# Altium schematic symbol library BARKO_SCHLIB.SchLib: 1064 symbols (part 10 of 11) (continued)
## R-910R-0603_1 (continued)
RES SMD 910 OHM 1% 1/10W 0603; Manufacturer: Vishay; Manufacturer Part Number: CRCW0603910RFKEA; Temperature Coefficient: 100ppm/°C; Power Rating: 100mW; Voltage Rating: 75V; .PCBCHK: USED; .Creator: F:TALI; Washability: OK; Stock 1: 7; Pricing 1: 1=0.09, 10=0.037, 100=0.0149, 1000=0.00668, 2500=0.0058 (EUR); Case/Package: 0603; Number of Pins: 2; Weight: 7.1E-05oz; Contact Plating: Tin; Case Code (Metric): 1608; Min Operating Temperature: -55°C; Max Operating Temperature: 155°C; Resistance: 910R; Tolerance: 1%; Composition: Thick Film; Packaging: Tape and Reel; Package Quantity: 10; Number of Terminations: 2; Termination: SMD/SMT; Max Power Dissipation: 100mW; Features: Automotive AEC-Q200; Military Standard: Not; Voltage Rating (DC): 75V; Length: 1.55mm; Height: 0.45mm; Width: 0.033inch; Depth: 0.85mm; Radiation Hardening: No; Lead Free: Lead Free; REACH SVHC: Unknown; ComponentLink1URL: https://www.distrelec.biz/Web/Downloads/a_/en/flD-CRCW-e3_data_en.pdf?mime=application%2Fpdf; ComponentLink1Description: https://www.distrelec.biz/Web/Downloads/a_/en/flD-CRCW-e3_data_en.pdf?mime=application%2Fpdf; ComponentLink2URL: http://www.vishay.com/docs/20035/dcrcwe3.pdf; ComponentLink2Description: http://www.vishay.com/docs/20035/dcrcwe3.pdf; ComponentLink3URL: http://www.farnell.com/datasheets/1697337.pdf; ComponentLink3Description: http://www.farnell.com/datasheets/1697337.pdf; ComponentLink4URL: http://uk.rs-online.com/webdocs/0d98/0900766b80d98afc.pdf; ComponentLink4Description: http://uk.rs-online.com/webdocs/0d98/0900766b80d98afc.pdf; ComponentLink5URL: http://www.mouser.com/ds/2/427/dcrcwe3-109170.pdf; ComponentLink5Description: http://www.mouser.com/ds/2/427/dcrcwe3-109170.pdf; ComponentLink6URL: https://www.alliedelec.com/m/d/0c934d6939ccefa68dbe0b96d821c8cf.pdf; ComponentLink6Description: https://www.alliedelec.com/m/d/0c934d6939ccefa68dbe0b96d821c8cf.pdf; Stock 2: 102470; Pricing 2: 1=0.1, 10=0.065, 100=0.0264, 1000=0.01186, 2500=0.01029 (USD); Mount: Surface Mount; ComponentLink7URL: http://www.farnell.com/datasheets/1678782.pdf; ComponentLink7Description: http://www.farnell.com/datasheets/1678782.pdf; ComponentLink8URL: http://www.mouser.com/ds/2/315/AOA0000C86-911473.pdf; ComponentLink8Description: http://www.mouser.com/ds/2/315/AOA0000C86-911473.pdf; Stock 3: 9760; Pricing 3: 1=0.1, 10=0.021, 100=0.0086, 1000=0.00385, 2500=0.00334 (USD); Thickness: 457um; ComponentLink9URL: http://www.bourns.com/docs/Product-Datasheets/CHPREZTR.pdf; ComponentLink9Description: http://www.bourns.com/docs/Product-Datasheets/CHPREZTR.pdf; ComponentLink10URL: http://www.bourns.com/pdfs/chpreztr.pdf; ComponentLink10Description: http://www.bourns.com/pdfs/chpreztr.pdf; .SCHCHK: USED; Supplier 1: Digi-Key; Supplier Part Number 1: 541-910HCT-ND
footprint R-0603
pins: 1, 2

## R-JMP-S1911-46R
designator R?, comment 0R
JUMPER TIN SMD; Manufacturer: Harwin; Manufacturer Part Number: S1911-46R; Number of Positions: 2; Gender: Non-Gendered; Pitch: 0.119inch; .Creator: M.OZKAN; .PCBCHK: USED; Supplier 1: Digi-Key; Supplier Part Number 1: 952-1740-1-ND; Stock: 75482; Pricing: 1=0.28, 10=0.27, 25=0.2312, 50=0.1964, 100=0.1887, 250=0.1694, 500=0.1617, 1000=0.1348 (USD); RoHS: Yes; Color: Silver; Contact Material: Brass,Copper Alloy; Contact Plating: Tin; Material: Brass; Plating: Tin; Orientation: Straight; Number of Contacts: 2; Package Quantity: 4000; Packaging: Tape and Reel; Number of Rows: 1; Termination: SMD/SMT; Length: 6.85mm; Height: 0.038inch; Depth: 2.51mm; REACH SVHC: No SVHC; ComponentLink1URL: https://datasheet.ciiva.com/22627/1682347-22627073.pdf?src-supplier=Element14; ComponentLink1Description: https://datasheet.ciiva.com/22627/1682347-22627073.pdf?src-supplier=Element14; ComponentLink2URL: https://datasheet.ciiva.com/5224/s1911r-64735-5224691.pdf?src-supplier=Mouser; ComponentLink2Description: https://datasheet.ciiva.com/5224/s1911r-64735-5224691.pdf?src-supplier=Mouser; ComponentLink3URL: https://datasheet.ciiva.com/26852/getdatasheetpartid-716620-26852325.pdf?src-supplier=Verical; ComponentLink3Description: https://datasheet.ciiva.com/26852/getdatasheetpartid-716620-26852325.pdf?src-supplier=Verical; ComponentLink4URL: https://datasheet.ciiva.com/30493/0900766b81270b7b-30493566.pdf?src-supplier=RSComponents; ComponentLink4Description: https://datasheet.ciiva.com/30493/0900766b81270b7b-30493566.pdf?src-supplier=RSComponents; ComponentLink5URL: https://datasheet.ciiva.com/6783/s1911r-6783671.pdf?src-supplier=Digi-Key; ComponentLink5Description: https://datasheet.ciiva.com/6783/s1911r-6783671.pdf?src-supplier=Digi-Key; .SCHCHK: USED
footprint R-JMP (Chip Resistor, 2-Leads, Body 6.85x2.00mm, IPC Medium Density)
pins: 1, 2

## RLY-ALDP124W
designator K?, comment ALDP124W
RELAY GEN PURPOSE SPST 5A 24V; Manufacturer: Panasonic; Voltage Rating (AC): 277V; Power Rating: 200mW; Coil Resistance: 2.88kR; Coil Current: 8.3mA; Operate Time: 10ms; Switching Capacity: 1.385kW; Relay Type: General Purpose; Coil Type: Non-Latching; Washability: OK; .Creator: M.OZKAN; .PCBCHK: USED; Supplier 1: Digi-Key; Manufacturer Part Number: ALDP124W; Stock 1: 7190; Pricing 1: 1=2,23000, 10=2,09300, 25=1,86000, 50=1,76700, 100=1,67400, 300=1,48800, 500=1,39500, 1000=1,30200, 5000=1,25550 (USD); RoHS: Yes; Number of Pins: 4; Contact Material: Silver; Contact Plating: Silver; Min Operating Temperature: -40°C; Max Operating Temperature: 85°C; Contact Current Rating: 5A; Package Quantity: 100; Packaging: Carton; Max Current Rating: 5A; Throw Configuration: SPST; Termination: PC Pin; Release Time: 10ms; Coil Power: 200mW; Max Voltage Rating (AC): 277V; Switching Current: 5A; Coil Voltage (DC): 24V; Length: 20.5mm; Depth: 7.2mm; Lead Free: Lead Free; ComponentLink1URL: https://datasheet.ciiva.com/18711/ds-61b10-en-ldp-18711613.pdf?src-supplier=Distrelec; ComponentLink1Description: https://datasheet.ciiva.com/18711/ds-61b10-en-ldp-18711613.pdf?src-supplier=Distrelec; Supplier Part Number 1: 255-3590-ND; .SCHCHK: USED
footprint RLY-ALD-P105
pins: 1, 2 NC, 3 NO, 4 COM, 5

## RLY-ALQ105
designator K?, comment ALQ105
RELAY GEN PURPOSE SPDT 10A 5V; Manufacturer: Panasonic; Max Voltage Rating (AC): 250V; Power Rating: 400mW; Coil Resistance: 62.5R; Coil Current: 80mA; Operate Time: 20ms; Coil Type: Non-Latching; Relay Type: General Purpose; Washability: OK; .Creator: M.OZKAN; .PCBCHK: USED; ComponentLink1Description: Manufacturer URL; ComponentLink3Description: Package Specification; ComponentLink1URL: http://www3.panasonic.biz/ac/ae/index.jsp; ComponentLink3URL: http://www3.panasonic.biz/ac/e_download/control/relay/power/catalog/mech_eng_lq.pdf?f_cd=401220; ComponentLink2Description: Datasheet; ComponentLink2URL: http://www3.panasonic.biz/ac/e_download/control/relay/power/catalog/mech_eng_lq.pdf?f_cd=401220; Supplier 1: Digi-Key; Manufacturer Part Number: ALQ105; Stock 1: 17120; Pricing 1: 1=1.22000, 10=1.14800, 25=1.02000, 50=0.96900, 100=0.91800, 250=0.81600, 500=0.76500, 1000=0.71400, 5000=0.68850 (USD); RoHS: Yes; Number of Pins: 5; Weight: 7g; Contact Material: Silver; Min Operating Temperature: -40°C; Max Operating Temperature: 85°C; Contact Current Rating: 10A; Package Quantity: 100; Packaging: Carton; Voltage Rating (AC): 250V; Power Consumption: 400mW; Throw Configuration: SPDT; Termination: PC Pin; Release Time: 20ms; Coil Power: 400mW; Coil Voltage (DC): 5V; Length: 20mm; Height: 16mm; Depth: 10mm; Width: 10mm; REACH SVHC: Unknown; Lead Free: Lead Free; ComponentLink4URL: http://www.farnell.com/datasheets/1972641.pdf?src-supplier=Farnell; ComponentLink4Description: http://www.farnell.com/datasheets/1972641.pdf?src-supplier=Farnell; ComponentLink5URL: http://www.mouser.com/ds/2/315/lq-catalog-1075796.pdf?src-supplier=Mouser; ComponentLink5Description: http://www.mouser.com/ds/2/315/lq-catalog-1075796.pdf?src-supplier=Mouser; ComponentLink6URL: http://components.arrow.com/part/dataview/0323_06571492?src-supplier=Arrow+Europe; ComponentLink6Description: http://components.arrow.com/part/dataview/0323_06571492?src-supplier=Arrow+Europe; ComponentLink7URL: http://www.alliedelec.com/m/d/b3e6213128df2023f710f2e9cac83292.pdf?src-supplier=Allied+Electronics; ComponentLink7Description: http://www.alliedelec.com/m/d/b3e6213128df2023f710f2e9cac83292.pdf?src-supplier=Allied+Electronics; ComponentLink8URL: https://media.digikey.com/pdf/Data%20Sheets/Panasonic%20Electric%20Works%20PDFs/ALQ(LQ)Relays_NewProdIntro.pdf?src-supplier=Digi-Key; ComponentLink8Description: https://media.digikey.com/pdf/Data%20Sheets/Panasonic%20Electric%20Works%20PDFs/ALQ(LQ)Relays_NewProdIntro.pdf?src-supplier=Digi-Key; ComponentLink9URL: http://www.farnell.com/datasheets/1972641.pdf?src-supplier=Element14; ComponentLink9Description: http://www.farnell.com/datasheets/1972641.pdf?src-supplier=Element14; .SCHCHK: USED
footprint PNSC-LQ-5-2000x1000x1600_V (LQ, 5-Leads, Body 20x10mm)
pins: 1, 2 NC, 3 NO, 4 COM, 5

## RLY-AZ943-1CH-18DE
designator RLY?, comment AZ943-1CH-18DE
15AMP Mini PC Board Relay 18VDC coil SPDT; Manufacturer: American Zettler; Coil Current: 20mA; Coil Resistance: 900R; Max Voltage Rating (AC): 300V; Max Voltage Rating (DC): 30V; Coil Voltage (DC): 18V; .Creator: F:TALI; .PCBCHK: USED; Washability: OK; Supplier 1: Electro Sonic; Manufacturer Part Number: AZ943-1CH-18DE; Stock 1: 365; Pricing 1: 35=0.8063, 50=0.6365 (USD); Mount: Through Hole; Number of Pins: 5; Min Operating Temperature: -40°C; Max Operating Temperature: 90°C; Throw Configuration: SPDT; Length: 19mm; Height: 15.7mm; Width: 15.3mm; ComponentLink1URL: http://www.onlinecomponents.com/productFiles/mf-AZ/az943.pdf?src-supplier=Onlinecomponents.com; ComponentLink1Description: http://www.onlinecomponents.com/productFiles/mf-AZ/az943.pdf?src-supplier=Onlinecomponents.com; ComponentLink2URL: http://www.produktinfo.conrad.com/datenblaetter/500000-524999/503613-da-01-en-RELAIS_ZETTLER_AZ943_1CH_18DE.pdf?src-supplier=Conrad; ComponentLink2Description: http://www.produktinfo.conrad.com/datenblaetter/500000-524999/503613-da-01-en-RELAIS_ZETTLER_AZ943_1CH_18DE.pdf?src-supplier=Conrad; Supplier Part Number 1: AZ9431CH18DE; .SCHCHK: USED
footprint RLY-AZ943
pins: 1, 2, 3, 4, 5

## RLY-CPC1706Y
designator K?, comment CPC1706Y
SSR RELAY SPST-NO 4A 0-60V; Manufacturer: IXYS; Output Voltage: 60V; Input Current: 50mA; On-State Resistance: 90mR; Isolation Voltage: 2.5kV; Throw Configuration: SPST; Supplier 1: Digi-Key; Supplier Part Number 1: CPC1706Y-ND; Manufacturer Part Number: CPC1706Y; Stock: 300; Pricing: 1=3, 10=2.813, 25=2.5, 50=2.375, 100=2.25, 250=2, 500=1.875, 1000=1.75, 5000=1.6875 (USD); RoHS: Yes; Mount: Through Hole; Case/Package: SIP; Number of Pins: 4; Min Operating Temperature: -40°C; Max Operating Temperature: 85°C; Termination: PC Pin; Output Current: 4A; Load Current: 4A; Max Output Voltage: 60V; Relay Type: Relay; Package Quantity: 25; Packaging: Rail/Tube; Radiation Hardening: No; Lead Free: Lead Free; ComponentLink1URL: https://datasheet.ciiva.com/6569/cpc1706-6569415.pdf?src-supplier=Digi-Key; ComponentLink1Description: https://datasheet.ciiva.com/6569/cpc1706-6569415.pdf?src-supplier=Digi-Key
footprint RLY-4SIP
pins: 1 -, 2 +, 3 -, 4 +

## RLY-CPC1709J
designator K?, comment CPC1709J
SSR RELAY SPST-NO 9A 0-60V; Manufacturer: Ixys Clare; Throw Configuration: SPST; Output Current: 32A; Input Current: 50mA; Max Power Dissipation: 150mW; On-State Resistance: 50mR; Max Output Voltage: 60V; Max Input Current: 100mA; Isolation Voltage: 2.5kV; Max Input Voltage: 1.4V; Supplier 1: Digi-Key; Supplier Part Number 1: CLA280-ND; Manufacturer Part Number: CPC1709J; Stock: 1167; Pricing: 1=6.29, 10=5.895, 25=5.24, 50=4.978, 100=4.716, 250=4.192, 500=3.93, 1000=3.668, 5000=3.537 (USD); RoHS: Yes; Mount: Through Hole; Number of Pins: 4; Min Operating Temperature: -40°C; Max Operating Temperature: 85°C; Package Quantity: 25; Termination: PC Pin; Load Current: 9A; Packaging: Rail/Tube; Relay Type: Relay; Max Output Current: 32A; Radiation Hardening: No; Lead Free: Lead Free; ComponentLink1URL: https://datasheet.ciiva.com/15709/2cpc1709-15709048.pdf?src-supplier=Onlinecomponents.com; ComponentLink1Description: https://datasheet.ciiva.com/15709/2cpc1709-15709048.pdf?src-supplier=Onlinecomponents.com; ComponentLink2URL: https://datasheet.ciiva.com/2421/cpc1709-2421621.pdf?src-supplier=Digi-Key; ComponentLink2Description: https://datasheet.ciiva.com/2421/cpc1709-2421621.pdf?src-supplier=Digi-Key
footprint RLY-ISOPLUS264 (SIL, 4-Leads, Body 21x3.5mm)
pins: 1 -, 2 +, 3 -, 4 +

## RT-NCP18XH103F03RB
designator RT?, comment 10K  Case Code (Imperial): 0603
THERMISTOR 10K OHM NTC 0603 SMD; Manufacturer: Murata; Manufacturer Part Number: NCP18XH103F03RB; Resistance: 10kR; Tolerance: 1%; Power Rating: 100mW; Current Rating: 310uA; Accuracy: 0.7%; .Creator: F:TALI; .PCBCHK: USED; Temperature Coefficient: 100ppm/°C; Washability: OK; Dielectric: X7R; Voltage Rating: 100V; Capacitance: 100nF; Supplier 1: Digi-Key; Stock 1: 17485; Pricing 1: 1=0.23, 5=0.222, 10=0.198, 25=0.182, 50=0.1456, 100=0.1249, 500=0.10926, 1000=0.09365 (USD); Mount: Surface Mount; Case/Package: 0603; Number of Pins: 2; Case Code (Metric): 1608; Number of Terminals: 2; Min Operating Temperature: -40°C; Max Operating Temperature: 125°C; Packaging: Tape and Reel; Package Quantity: 1; Termination: SMD/SMT; Max Power Dissipation: 100mW; Length: 1.6mm; Height: 0.8mm; Depth: 0.8mm; Radiation Hardening: No; REACH SVHC: No SVHC; Lead Free: Lead Free; ComponentLink1URL: http://www.mouser.com/ds/2/281/r44e-522712.pdf; ComponentLink1Description: http://www.mouser.com/ds/2/281/r44e-522712.pdf; ComponentLink2URL: http://uk.rs-online.com/webdocs/07f1/0900766b807f1e39.pdf; ComponentLink2Description: http://uk.rs-online.com/webdocs/07f1/0900766b807f1e39.pdf; ComponentLink3URL: http://www.murata.com/~/media/webrenewal/support/library/catalog/products/thermistor/ntc/r44e.ashx; ComponentLink3Description: http://www.murata.com/~/media/webrenewal/support/library/catalog/products/thermistor/ntc/r44e.ashx; ComponentLink4URL: https://www.verical.com/server-webapp/html/getDatasheet?partID=153236; ComponentLink4Description: https://www.verical.com/server-webapp/html/getDatasheet?partID=153236; ComponentLink5URL: https://www.murata.com/~/media/webrenewal/support/library/catalog/products/thermistor/ntc/r44e.ashx?la=en-us; ComponentLink5Description: https://www.murata.com/~/media/webrenewal/support/library/catalog/products/thermistor/ntc/r44e.ashx?la=en-us; ComponentLink6URL: http://search.murata.co.jp/Ceramy/image/img/w_hinm/L0770E.pdf; ComponentLink6Description: http://search.murata.co.jp/Ceramy/image/img/w_hinm/L0770E.pdf; Supplier Part Number 1: 490-4800-6-ND; .SCHCHK: USED; RoHS: Yes; Composition: Metal Foil; Number of Terminations: 2; Features: Automotive AEC-Q200; Width: 1.6mm; ComponentLink7URL: https://datasheet.ciiva.com/14981/krl-new-short-data-sheet-14981981.pdf?src-supplier=Digi-Key; ComponentLink7Description: https://datasheet.ciiva.com/14981/krl-new-short-data-sheet-14981981.pdf?src-supplier=Digi-Key; ComponentLink8URL: https://datasheet.ciiva.com/14981/krl-new-short-data-sheet-14981982.pdf?src-supplier=Digi-Key; ComponentLink8Description: https://datasheet.ciiva.com/14981/krl-new-short-data-sheet-14981982.pdf?src-supplier=Digi-Key; Stock: 963388; Pricing: 1=0.1, 10=0.054, 50=0.0294, 100=0.0239, 500=0.0171, 1000=0.0134 (USD); Thickness: 0.053inch; ComponentLink9URL: https://datasheet.ciiva.com/26936/getdatasheetpartid-781823-26936904.pdf?src-supplier=Verical; ComponentLink9Description: https://datasheet.ciiva.com/26936/getdatasheetpartid-781823-26936904.pdf?src-supplier=Verical
footprint R-0603
pins: 1, 2

## SSR-CPC1017NTR
designator U?, comment CPC1017NTR  Case/Package: 4-SOP
SSR RELAY SPST-NO 100MA 0-60V; Manufacturer: Ixys Clare; Output Voltage: 60V; Throw Configuration: SPST; Max Input Voltage: 1.4V; On-State Resistance: 16R; Max Power Dissipation: 400mW; Max Input Current: 50mA; Isolation Voltage: 1.5kV; Number of Channels: 1; Capacitance: 1pF; Turn-On Delay Time: 10ms; Washability: OK; .Creator: M.OZKAN; .PCBCHK: USED; Supplier 1: Digi-Key; Manufacturer Part Number: CPC1017NTR; Stock 1: 25719; Pricing 1: 1=0,79000, 10=0,74300, 25=0,66000, 50=0,62700, 100=0,59400, 250=0,52800, 500=0,49500, 1000=0,46200 (USD); RoHS: Yes; Mount: Surface Mount; Number of Pins: 4; Min Operating Temperature: -40°C; Max Operating Temperature: 85°C; Output Current: 100mA; Packaging: Tape and Reel; Max Output Current: 100mA; Package Quantity: 2000; Load Current: 100mA; Termination: Gull Wing; Max Output Voltage: 60V; Input Current: 50mA; Relay Type: Relay; Turn-Off Delay Time: 10ms; Length: 4.089mm; Height: 2.184mm; Width: 3.8mm; Radiation Hardening: No; ComponentLink1URL: https://datasheet.ciiva.com/2421/cpc1017n-2421248.pdf?src-supplier=Digi-Key; ComponentLink1Description: https://datasheet.ciiva.com/2421/cpc1017n-2421248.pdf?src-supplier=Digi-Key; ComponentLink2URL: https://datasheet.ciiva.com/2421/cpc1017n-2421249.pdf?src-supplier=Digi-Key; ComponentLink2Description: https://datasheet.ciiva.com/2421/cpc1017n-2421249.pdf?src-supplier=Digi-Key; ComponentLink3URL: https://datasheet.ciiva.com/4469/cpc1017n-16278-4469629.pdf?src-supplier=Mouser; ComponentLink3Description: https://datasheet.ciiva.com/4469/cpc1017n-16278-4469629.pdf?src-supplier=Mouser; ComponentLink4URL: https://datasheet.ciiva.com/2421/cpc1017n-2421247.pdf?src-supplier=Digi-Key; ComponentLink4Description: https://datasheet.ciiva.com/2421/cpc1017n-2421247.pdf?src-supplier=Digi-Key; Supplier Part Number 1: CLA233CT-ND; .SCHCHK: USED
footprint SOP_4
pins: 1 CNTRL+, 2 CNTRL-, 3 LOAD, 4 LOAD

## SW5-00P
designator SW?, comment SW5-00P-150-C5
SWITCH SNAP ACTION SPDT 5A 250V; Washability: OK; .Creator: M.OZKAN; .PCBCHK: USED; .SCHCHK: USED
footprint SW5-00P (SW5-00P-150-C5  SWITCH SNAP ACTION SPDT 5A 250V)
pins: C COM, NC, NO

## SW-AYZ0202AGRLC
designator SW?, comment DPDT
SWITCH SLIDE DPDT 100MA 12V; Manufacturer: ITT C&K; Manufacturer Part Number: AYZ0202AGRLC; Mechanical Life: 10000Cycles; Actuator Material: Nylon,Glass,Polyamide,Glass fibre; Actuator Type: Standard; Illumination Type: Non-Illuminated; Contact Resistance: 80mR; Switch Function: On-On; Actuator Length: 1mm; Supplier 1: RSComponents; Supplier Part Number 1: 7931504; Stock: 377; Pricing: 1=1.326, 50=1.209, 100=1.105, 1000=1.027, 3000=0.962, 1=10.2, 50=9.3, 100=8.5, 1000=7.9, 3000=7.4 (EUR); RoHS: Yes; Mount: Surface Mount,PCB; Case/Package: 100; Contact Material: Copper Alloy,Brass,Silver; Housing Material: Glass; Contact Plating: Silver; Min Operating Temperature: -10°C; Max Operating Temperature: 60°C; Termination: Gull Wing; Throw Configuration: DPDT; Max Current Rating: 100mA; Max Voltage Rating (DC): 12V; Voltage Rating (DC): 12V; Package Quantity: 1; Packaging: Tape and Reel; Current Rating: 100mA; Contact Current Rating: 100mA; Orientation: Vertical; Length: 7.2mm; Depth: 6mm; Radiation Hardening: No; Lead Free: Lead Free; REACH SVHC: No SVHC; ComponentLink1URL: https://datasheet.ciiva.com/16417/ayz0202agrlc-16417120.pdf?src-supplier=Future+Electronics; ComponentLink1Description: https://datasheet.ciiva.com/16417/ayz0202agrlc-16417120.pdf?src-supplier=Future+Electronics; ComponentLink2URL: https://datasheet.ciiva.com/2889/ayz-16oct13-2889189.pdf?src-supplier=Digi-Key; ComponentLink2Description: https://datasheet.ciiva.com/2889/ayz-16oct13-2889189.pdf?src-supplier=Digi-Key; ComponentLink3URL: https://datasheet.ciiva.com/8624/ayz-16oct13-8624741.pdf?src-supplier=Avnet; ComponentLink3Description: https://datasheet.ciiva.com/8624/ayz-16oct13-8624741.pdf?src-supplier=Avnet; ComponentLink4URL: https://datasheet.ciiva.com/2889/ayz-16oct13-2889190.pdf?src-supplier=Digi-Key; ComponentLink4Description: https://datasheet.ciiva.com/2889/ayz-16oct13-2889190.pdf?src-supplier=Digi-Key; ComponentLink5URL: https://datasheet.ciiva.com/2889/ayz-16oct13-2889191.pdf?src-supplier=Digi-Key; ComponentLink5Description: https://datasheet.ciiva.com/2889/ayz-16oct13-2889191.pdf?src-supplier=Digi-Key; ComponentLink6URL: https://datasheet.ciiva.com/16174/ayz-24mar-16174248.pdf?src-supplier=Onlinecomponents.com; ComponentLink6Description: https://datasheet.ciiva.com/16174/ayz-24mar-16174248.pdf?src-supplier=Onlinecomponents.com; ComponentLink7URL: https://datasheet.ciiva.com/22630/1707705-22630555.pdf?src-supplier=Element14; ComponentLink7Description: https://datasheet.ciiva.com/22630/1707705-22630555.pdf?src-supplier=Element14
footprint SW-AYZ0202AGRLC
pins: 1, 2, 3, 4, 5, 6

## SW-B3S-1000P
designator SW?, comment B3S-1000P  Supplier Part Number 1: SW836CT-ND
SWITCH TACTILE SPST-NO 0.05A 24V; Manufacturer 1: Omron; Throw Configuration: SPST; Switch Function: Off-Mom; Switch Travel: 0.25mm; Contact Current Rating: 50mA; Actuator Length: 0.8mm; Mechanical Life: 500000Cycles; Contact Resistance: 100mR; Operating Force: 1.57N; Actuator Type: Standard; Illumination Type: Non-Illuminated; Ratings: IP67; Number of Poles: 1; Package Quantity: 1; Orientation: Straight; REACH SVHC: No SVHC; Lead Free: Lead Free; Max Current Rating: 50mA; Contact Plating: Silver; Current Rating: 50mA; Depth: 9mm; Contact Material: Bronze; Electrical Life: 500000Cycles; Termination: Gull Wing; Width: 6mm; Packaging: Tape and Reel; Min Operating Temperature: -25°C; Radiation Hardening: No; Max Voltage Rating (DC): 24V; Max Operating Temperature: 70°C; Length: 6.6mm; Height: 3.65mm; Voltage Rating (DC): 24V; Weight: 0.010582oz; Mount: Surface Mount; Supplier 1: Digi-Key; Manufacturer Part Number: B3S-1000P; Stock 1: 141614; Pricing 1: 1=0,65000, 10=0,63100, 25=0,60640, 100=0,52620, 250=0,48016, 500=0,44620 (USD); RoHS: Yes; ComponentLink1URL: https://datasheet.ciiva.com/2899/b3s-1110-2899873.pdf?src-supplier=Digi-Key; ComponentLink1Description: https://datasheet.ciiva.com/2899/b3s-1110-2899873.pdf?src-supplier=Digi-Key; ComponentLink2URL: https://datasheet.ciiva.com/2899/b3s-1110-2899874.pdf?src-supplier=Digi-Key; ComponentLink2Description: https://datasheet.ciiva.com/2899/b3s-1110-2899874.pdf?src-supplier=Digi-Key; ComponentLink3URL: https://datasheet.ciiva.com/2899/b3s-1110-2899875.pdf?src-supplier=Digi-Key; ComponentLink3Description: https://datasheet.ciiva.com/2899/b3s-1110-2899875.pdf?src-supplier=Digi-Key; ComponentLink4URL: https://datasheet.ciiva.com/15183/getdatasheetpartid-211358-15183771.pdf?src-supplier=Verical; ComponentLink4Description: https://datasheet.ciiva.com/15183/getdatasheetpartid-211358-15183771.pdf?src-supplier=Verical; ComponentLink5URL: https://datasheet.ciiva.com/27056/2086750-27056652.pdf?src-supplier=Jameco; ComponentLink5Description: https://datasheet.ciiva.com/27056/2086750-27056652.pdf?src-supplier=Jameco; ComponentLink6URL: https://datasheet.ciiva.com/16155/en-b3s-16155006.pdf?src-supplier=Onlinecomponents.com; ComponentLink6Description: https://datasheet.ciiva.com/16155/en-b3s-16155006.pdf?src-supplier=Onlinecomponents.com; ComponentLink7URL: https://datasheet.ciiva.com/30125/en-b3s-30125455.pdf?src-supplier=Onlinecomponents.com; ComponentLink7Description: https://datasheet.ciiva.com/30125/en-b3s-30125455.pdf?src-supplier=Onlinecomponents.com
footprint CON-FP-B3S-1000P-MFG
pins: 1, 2, 3, 4

## SW-MEMBRAN
designator SW?  (value not drawn)
.Creator: F:TALI; .PCBCHK: USED; Washability: OK; .SCHCHK: USED
footprint MEMBRAN-ROUND-10MM
pins: 1, 2

## SW-MJTP1117
designator SW?  (value not drawn)
SWITCH TACTILE SPST-NO 0.05A 12V; Manufacturer: APEM; Manufacturer Part Number: MJTP1117; Mechanical Life: 100000Cycles; Actuator Material: Thermoplastic; Operating Force: 180gf; Throw Configuration: SPST; Contact Resistance: 100mR; Current Rating: 50mA; Illumination Type: Non-Illuminated; Switch Travel: 0.25mm; Switch Function: Off-Mom; Actuator Length: 1.45mm; .PCBCHK: USED; .Creator: F:TALI; Washability: OK; Supplier 1: Digi-Key; Stock 1: 34701; Pricing 1: 1=0.45, 50=0.4106, 100=0.3542, 500=0.3059, 1000=0.2415, 5000=0.2254 (USD); Mount: Through Hole; Contact Material: Bronze,Stainless Steel; Contact Plating: Silver; Min Operating Temperature: -20°C; Max Operating Temperature: 70°C; Package Quantity: 100; Packaging: Bulk; Voltage Rating (DC): 12V; Max Voltage Rating (DC): 12V; Termination: PC Pin; Electrical Life: 100000Cycles; Orientation: Right Angle; Supplier Part Number 1: 679-2400-ND; .SCHCHK: USED
pins: 1, 2

## SW-SS-5T
designator SW?, comment SPDT
SWITCH SNAP ACTION SPDT 5A 125V; Manufacturer: Omron; Manufacturer Part Number: SS-5T; Mechanical Life: 30000000Cycles; Operating Force: 1.47N; Voltage Rating (DC): 30V; Max Voltage Rating (DC): 14V; Current Rating: 4A; Electrical Life: 200000Cycles; Number of Poles: 1; Pretravel: 0.02inch; Differential Travel: 0.004inch; Operating Position: 0.33inch; Switch Function: On-Mom; Ratings: IP40; Approvals: CSA,UL; .Creator: F:TALI; .PCBCHK: USED; Washability: OK; Supplier 1: Digi-Key; Supplier Part Number 1: SW141-ND; Stock 1: 4164; Pricing 1: 1=2.2, 10=2.035, 25=1.908, 50=1.8658, 100=1.4841, 250=1.39932, 500=1.3145, 1000=1.2297, 5000=1.14489 (USD); Mount: Chassis Mount,Screw; Case/Package: 125; Weight: 1.6g; Contact Material: Silver; Min Operating Temperature: -25°C; Max Operating Temperature: 85°C; Max Current Rating: 5A; Voltage Rating (AC): 125V; Max Voltage Rating (AC): 125V; Throw Configuration: SPDT; Package Quantity: 500; Contact Current Rating: 5A; Packaging: Bulk; Termination: Quick Connect; Orientation: Straight; Overtravel: 0.02inch; Length: 19.8mm; Depth: 6.4mm; REACH SVHC: Unknown; Lead Free: Lead Free; ComponentLink1URL: http://www.omron.com/ecb/products/pdf/en-ss.pdf?src-supplier=Digi-Key; ComponentLink1Description: http://www.omron.com/ecb/products/pdf/en-ss.pdf?src-supplier=Digi-Key; ComponentLink2URL: https://www.distrelec.biz/Web/Downloads/24/01/03572401.pdf?mime=application%2Fpdf&src-supplier=Distrelec; ComponentLink2Description: https://www.distrelec.biz/Web/Downloads/24/01/03572401.pdf?mime=application%2Fpdf&src-supplier=Distrelec; ComponentLink3URL: https://www.components.omron.com/components/web/pdflib.nsf/0/80FC48E7A8A557A885257201007DD493/$file/SS_1110.pdf?src-supplier=Avnet; ComponentLink3Description: https://www.components.omron.com/components/web/pdflib.nsf/0/80FC48E7A8A557A885257201007DD493/$file/SS_1110.pdf?src-supplier=Avnet; ComponentLink4URL: https://www.alliedelec.com/m/d/4bac659ac71603589768c71b5ea7cc57.pdf?src-supplier=Allied+Electronics; ComponentLink4Description: https://www.alliedelec.com/m/d/4bac659ac71603589768c71b5ea7cc57.pdf?src-supplier=Allied+Electronics; .SCHCHK: USED
footprint SPDT-SS5T
pins: C COM, NC, NO

## SW-TACTILE-5MM
designator SW?
SWITCH TACTILE SPST-NO 0.05A 24V; Manufacturer: TE Connectivity AMP; Manufacturer Part Number: FSM4JSMA; Mechanical Life: 100000Cycles; Actuator Material: Polyamide; Operating Force: 1.57N; Throw Configuration: SPST; Max Voltage Rating (DC): 12V; Current Rating: 50mA; Illumination Type: Illuminated,Non-Illuminated; Contact Resistance: 100mR; Switch Travel: 0.25mm; Switch Function: Off-Mom; Actuator Type: Standard; Actuator Length: 0.055inch; .PCBCHK: USED; .Creator: F:TALI; Washability: OK; Supplier 1: Digi-Key; Stock 1: 31344; Pricing 1: 1=0.23, 10=0.218, 25=0.2108, 50=0.2032, 100=0.192, 250=0.18068, 500=0.17314, 1000=0.13174, 5000=0.10916 (USD); Mount: Surface Mount; Case/Package: SMA; Contact Material: Copper Alloy; Contact Plating: Silver; Min Operating Temperature: -35°C; Max Operating Temperature: 85°C; Voltage Rating (DC): 24V; Packaging: Loose Piece; Termination: Gull Wing; Orientation: Straight; Package Quantity: 750; Contact Current Rating: 50mA; Electrical Life: 100000Cycles; Voltage Rating: 24V; Type: Switch; Length: 6mm; Width: 6mm; REACH SVHC: Unknown; ComponentLink1URL: https://www.alliedelec.com/m/d/12a87fa7d0b178a96761783f66d58fa4.pdf; ComponentLink1Description: https://www.alliedelec.com/m/d/12a87fa7d0b178a96761783f66d58fa4.pdf; ComponentLink2URL: http://www.onlinecomponents.com/productFiles/mf-AO/eng_cat_1308390_0904_e3_e10_.pdf; ComponentLink2Description: http://www.onlinecomponents.com/productFiles/mf-AO/eng_cat_1308390_0904_e3_e10_.pdf; ComponentLink3URL: https://www.te.com/commerce/DocumentDelivery/DDEController?Action=srchrtrv&DocNm=1308111-1_SWITCHES_CORE_PROGRAM_CATALOG&DocType=CS&DocLang=English; ComponentLink3Description: https://www.te.com/commerce/DocumentDelivery/DDEController?Action=srchrtrv&DocNm=1308111-1_SWITCHES_CORE_PROGRAM_CATALOG&DocType=CS&DocLang=English; Supplier Part Number 1: 450-1129-ND; .SCHCHK: USED
pins: 1, 2, 3, 4

## SW-TL3300AF160Q
designator SW?
SWITCH TACTILE SPST-NO 0.05A 12V; Manufacturer: E-Switch; Manufacturer Part Number: DTSMW-24R-Q-T/R; Mechanical Life: 200000Cycles; Switch Function: Off-Mom; Throw Configuration: SPST; Illumination Type: Non-Illuminated; Current Rating: 50mA; Operating Force: 160gf; Switch Travel: 0.35mm; Supplier 1: Digi-Key; Supplier Part Number 1: EG4902CT-ND; Stock: 6931; Pricing: 1=0.6, 10=0.582, 25=0.5604, 100=0.4851, 250=0.442 (USD); RoHS: Yes; Mount: Surface Mount; Case/Package: SMD/SMT; Contact Plating: Silver; Min Operating Temperature: -25°C; Max Operating Temperature: 70°C; Termination: Gull Wing; Package Quantity: 1; Packaging: Tape and Reel; Voltage Rating (DC): 12V; ComponentLink1URL: https://datasheet.ciiva.com/2900/n301106b-2900869.pdf?src-supplier=Digi-Key; ComponentLink1Description: https://datasheet.ciiva.com/2900/n301106b-2900869.pdf?src-supplier=Digi-Key; ComponentLink2URL: https://datasheet.ciiva.com/2900/n301106b-2900870.pdf?src-supplier=Digi-Key; ComponentLink2Description: https://datasheet.ciiva.com/2900/n301106b-2900870.pdf?src-supplier=Digi-Key; ComponentLink3URL: https://datasheet.ciiva.com/2900/n301106b-2900871.pdf?src-supplier=Digi-Key; ComponentLink3Description: https://datasheet.ciiva.com/2900/n301106b-2900871.pdf?src-supplier=Digi-Key
footprint TACTILE-TL3300
pins: 1, 2, 3, 4

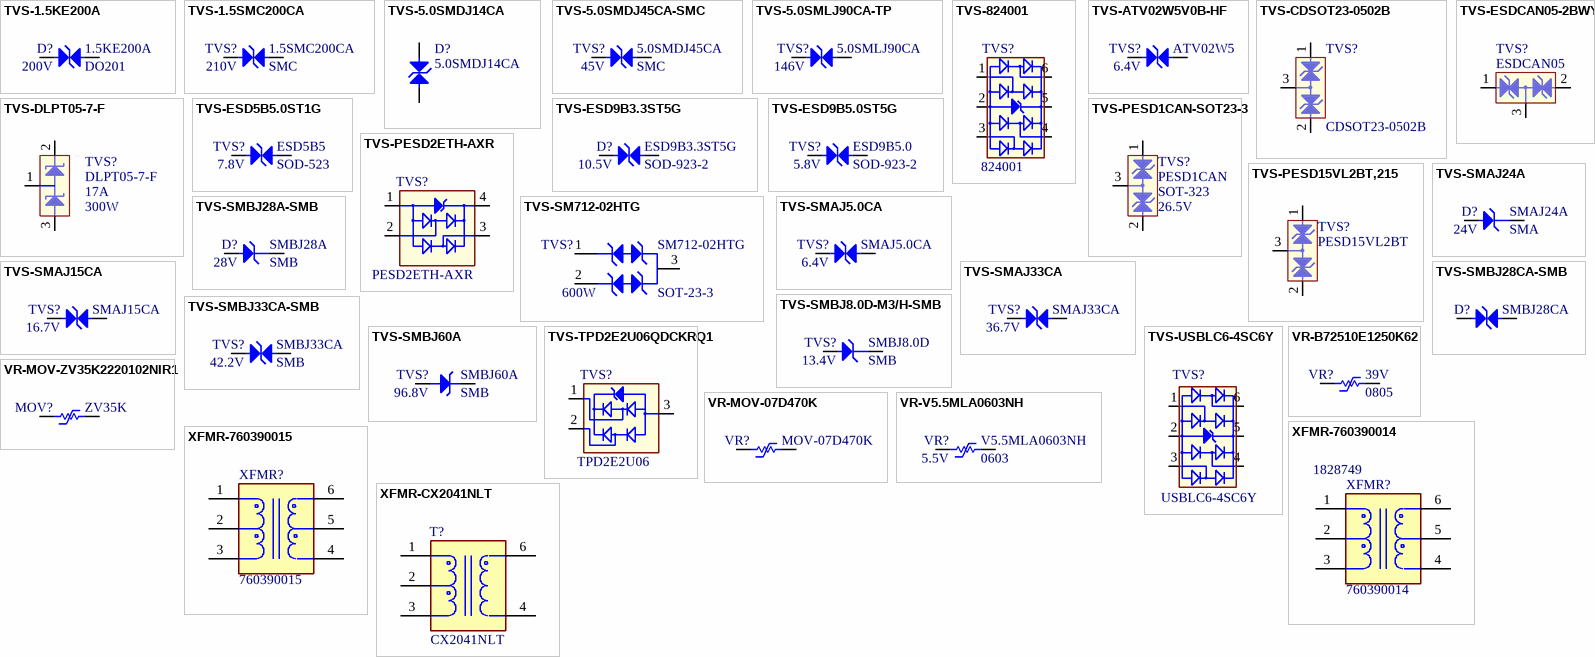
[diagram p41: symbols TVS-1.5KE200A to XFMR-CX2041NLT]

## TVS-1.5KE200A
designator D?, comment 1.5KE200A  Package: DO201  Voltage Rating (DC): 200V
TVS DIODE 171VWM 353VC DO201; Manufacturer: STMicroelectronics; Max Surge Current: 1mA; Reverse Breakdown Voltage: 190V; Number of Elements: 1; Reverse Standoff Voltage: 171V; Clamping Voltage: 353V; Peak Pulse Power: 1.5kW; Peak Pulse Current: 28A; Leakage Current: 1uA; Power Line Protection: No; Direction: Unidirectional; Element Configuration: Single; Max Breakdown Voltage: 210V; Capacitance: 675pF; .Creator: F:TALI; .PCBCHK: USED; Washability: OK; Supplier 1: Digi-Key; Manufacturer Part Number: 1.5KE200A; Stock 1: 1803; Pricing 1: 1=0.71, 10=0.628, 100=0.4816 (USD); Mount: Through Hole; Number of Pins: 2; Min Operating Temperature: -65°C; Max Operating Temperature: 175°C; Package Quantity: 600; Packaging: Tape and Reel; Min Breakdown Voltage: 190V; Breakdown Voltage: 190V; Termination: Through Hole; Test Current: 1mA; Number of Unidirectional Channels: 1; Composition: Zener; Operating Supply Voltage: 171V; Max Reverse Leakage Current: 1uA; Max Power Dissipation: 1.5kW; Power Dissipation: 1.5kW; Diameter: 5.3mm; Length: 9.5mm; Height: 5.3mm; Width: 5.3mm; Radiation Hardening: No; Lead Free: Lead Free; REACH SVHC: No SVHC; ComponentLink1URL: http://www.farnell.com/datasheets/1689681.pdf; ComponentLink1Description: http://www.farnell.com/datasheets/1689681.pdf; ComponentLink2URL: https://www.verical.com/server-webapp/html/getDatasheet?partID=71673; ComponentLink2Description: https://www.verical.com/server-webapp/html/getDatasheet?partID=71673; ComponentLink3URL: http://www.st.com/content/ccc/resource/technical/document/datasheet/03/7a/4e/3b/96/c3/4e/37/CD00000663.pdf/files/CD00000663.pdf/jcr:content/translations/en.CD00000663.pdf; ComponentLink3Description: http://www.st.com/content/ccc/resource/technical/document/datasheet/03/7a/4e/3b/96/c3/4e/37/CD00000663.pdf/files/CD00000663.pdf/jcr:content/translations/en.CD00000663.pdf; ComponentLink4URL: http://www.st.com/web/en/resource/technical/document/datasheet/CD00000663.pdf; ComponentLink4Description: http://www.st.com/web/en/resource/technical/document/datasheet/CD00000663.pdf; ComponentLink5URL: http://www.alliedelec.com/images/products/datasheets/bm/STMICROELECTRONICS/70013809.pdf; ComponentLink5Description: http://www.alliedelec.com/images/products/datasheets/bm/STMICROELECTRONICS/70013809.pdf; ComponentLink6URL: http://www.produktinfo.conrad.com/datenblaetter/1100000-1199999/001184202-da-01-en-TRANSIL_1500W_200V_1_5KE200A_DO_201_STM.pdf; ComponentLink6Description: http://www.produktinfo.conrad.com/datenblaetter/1100000-1199999/001184202-da-01-en-TRANSIL_1500W_200V_1_5KE200A_DO_201_STM.pdf; Supplier Part Number 1: 497-6644-1-ND; Polarity: Unidirectional; .SCHCHK: USED
footprint D-DO-201-H
pins: A, C

## TVS-1.5SMC200CA
designator TVS?, comment 1.5SMC200CA  Max Breakdown Voltage: 210V  Package: SMC
TVS DIODE 171V 274V DO214AB; Manufacturer: Littelfuse; Peak Pulse Power: 1.5kW; Peak Pulse Current: 5.5A; Polarity: Bidirectional; Min Breakdown Voltage: 190V; Number of Channels: 1; Test Current: 1mA; Power Line Protection: No; Leakage Current: 1uA; Voltage Rating (DC): 200V; Washability: OK; .Creator: M.OZKAN; .PCBCHK: USED; Supplier 1: Mouser; Manufacturer Part Number: 1.5SMC200CA; Stock 1: 2945; Pricing 1: 1=0,72000, 10=0,56300, 100=0,42700, 500=0,38400, 1000=0,29100, 3000=0,27500 (USD); RoHS: Yes; Mount: Surface Mount; Number of Pins: 2; Min Operating Temperature: -55°C; Max Operating Temperature: 150°C; Clamping Voltage: 274V; Packaging: Tape and Reel; Reverse Standoff Voltage: 171V; Breakdown Voltage: 190V; Package Quantity: 3000; Operating Supply Voltage: 171V; Max Surge Current: 5.5A; Direction: Bidirectional; Composition: Zener; Number of Bidirectional Channels: 1; Number of Elements: 1; Reverse Breakdown Voltage: 190V; Termination: SMD/SMT; Power Dissipation: 1.5kW; Length: 8.13mm; Height: 2.62mm; Width: 6.22mm; Lead Free: Lead Free; ComponentLink1URL: https://datasheet.ciiva.com/341/littelfuse-tvs-diode-1-5smc-datasheet-pdf-341221.pdf?src-supplier=Digi-Key; ComponentLink1Description: https://datasheet.ciiva.com/341/littelfuse-tvs-diode-1-5smc-datasheet-pdf-341221.pdf?src-supplier=Digi-Key; ComponentLink2URL: https://datasheet.ciiva.com/6574/littelfuse-tvs-diode-1-5smc-datasheet-pdf-6574613.pdf?src-supplier=Digi-Key; ComponentLink2Description: https://datasheet.ciiva.com/6574/littelfuse-tvs-diode-1-5smc-datasheet-pdf-6574613.pdf?src-supplier=Digi-Key; ComponentLink3URL: https://datasheet.ciiva.com/341/littelfuse-tvs-diode-1-5smc-datasheet-pdf-341222.pdf?src-supplier=Digi-Key; ComponentLink3Description: https://datasheet.ciiva.com/341/littelfuse-tvs-diode-1-5smc-datasheet-pdf-341222.pdf?src-supplier=Digi-Key; Supplier Part Number 1: 576-1.5SMC200CA; .SCHCHK: USED
footprint D-SMC-DO214AB-CA
pins: A, C

## TVS-5.0SMDJ14CA
designator D?, comment 5.0SMDJ14CA
TVS DIODE 14V 23.2V DO214AB; Manufacturer: Littelfuse; Number of Bidirectional Channels: 1; Min Breakdown Voltage: 15.6V; Peak Pulse Power: 5kW; Power Line Protection: No; Peak Pulse Current: 216A; Polarity: Bidirectional; Test Current: 10mA; Leakage Current: 400uA; Washability: OK; .Creator: M.OZKAN; .PCBCHK: USED; Supplier 1: Digi-Key; Manufacturer Part Number: 5.0SMDJ14CA; Stock 1: 2844; Pricing 1: 1=1.90000, 10=1.70600, 25=1.60960, 100=1.25540, 250=1.22324, 500=1.06228, 1000=0.90132 (USD); RoHS: Yes; Mount: Surface Mount; Number of Pins: 2; Min Operating Temperature: -55°C; Max Operating Temperature: 150°C; Reverse Standoff Voltage: 14V; Clamping Voltage: 23.2V; Composition: Zener; Package Quantity: 1; Packaging: Tape and Reel; Operating Supply Voltage: 14V; Max Surge Current: 216A; Reverse Breakdown Voltage: 15.6V; Breakdown Voltage: 15.6V; Number of Channels: 1; Termination: SMD/SMT; Number of Elements: 1; Max Power Dissipation: 5kW; Lead Free: Lead Free; ComponentLink1URL: https://datasheet.ciiva.com/341/littelfuse-tvs-diode-5-0smdj-datasheet-pdf-341407.pdf?src-supplier=Digi-Key; ComponentLink1Description: https://datasheet.ciiva.com/341/littelfuse-tvs-diode-5-0smdj-datasheet-pdf-341407.pdf?src-supplier=Digi-Key; ComponentLink2URL: https://datasheet.ciiva.com/341/littelfuse-tvs-diode-5-0smdj-datasheet-pdf-341406.pdf?src-supplier=Digi-Key; ComponentLink2Description: https://datasheet.ciiva.com/341/littelfuse-tvs-diode-5-0smdj-datasheet-pdf-341406.pdf?src-supplier=Digi-Key; Supplier Part Number 1: F6610CT-ND; .SCHCHK: USED
footprint D-SMC-DO214AB-CA
pins: A 2, C 1

## TVS-5.0SMDJ45CA-SMC
designator TVS?, comment 5.0SMDJ45CA  Reverse Standoff Voltage: 45V  Package / Case: SMC
TVS DIODE 45VWM 72.7VC SMD; Manufacturer: Littelfuse; Reverse Breakdown Voltage: 50V; Max Surge Current: 66.8A; Number of Bidirectional Channels: 1; Clamping Voltage: 72.7V; Peak Pulse Power: 5kW; Power Line Protection: No; Polarity: Bidirectional; Peak Pulse Current: 68.8A; Test Current: 1mA; Max Breakdown Voltage: 55.3V; Leakage Current: 5uA; Voltage Rating (DC): 28V; Direction: Unidirectional; Max Reverse Leakage Current: 1uA; Power Dissipation: 600W; Element Configuration: Single; .PCBCHK: USED; .Creator: F:TALI; Washability: OK; Supplier 1: Digi-Key; Supplier Part Number 1: F4124CT-ND; Manufacturer Part Number: 5.0SMDJ45CA; Stock 1: 12513; Pricing 1: 1=3.03, 10=2.735, 25=2.4416, 100=2.1976, 250=1.95336, 500=1.7092, 1000=1.4162 (USD); Mount: Surface Mount; Number of Pins: 2; Min Operating Temperature: -55°C; Max Operating Temperature: 150°C; Packaging: Tape and Reel; Package Quantity: 3000; Min Breakdown Voltage: 50V; Breakdown Voltage: 50V; Number of Channels: 1; Termination: SMD/SMT; Number of Elements: 1; Composition: Zener; REACH SVHC: Unknown; Lead Free: Lead Free; ComponentLink1URL: http://www.littelfuse.com/products/tvs-diodes/surface-mount/~/media/electronics/datasheets/tvs_diodes/littelfuse_tvs_diode_5_0smdj_datasheet.pdf.pdf; ComponentLink1Description: http://www.littelfuse.com/products/tvs-diodes/surface-mount/~/media/electronics/datasheets/tvs_diodes/littelfuse_tvs_diode_5_0smdj_datasheet.pdf.pdf; Case/Package: SMB; Number of Unidirectional Channels: 1; Max Power Dissipation: 600W; Current: 1mA; Voltage: 28V; Length: 4.57mm; Height: 2.237mm; Width: 3.94mm; Radiation Hardening: No; ComponentLink2URL: http://www.littelfuse.com/~/media/electronics/datasheets/tvs_diodes/littelfuse_tvs_diode_smbj_datasheet.pdf.pdf; ComponentLink2Description: http://www.littelfuse.com/~/media/electronics/datasheets/tvs_diodes/littelfuse_tvs_diode_smbj_datasheet.pdf.pdf; ComponentLink3URL: http://www.farnell.com/datasheets/13057.pdf; ComponentLink3Description: http://www.farnell.com/datasheets/13057.pdf; Weight: 0.00328oz; ComponentLink4URL: http://www.littelfuse.com/data/en/Data_Sheets/Littelfuse_TVS-Diode_SMBJ.pdf; ComponentLink4Description: http://www.littelfuse.com/data/en/Data_Sheets/Littelfuse_TVS-Diode_SMBJ.pdf; ComponentLink5URL: https://www.distrelec.biz/Web/Downloads/g_/ds/smbj_eng_ds.pdf?mime=application%2Fpdf; ComponentLink5Description: https://www.distrelec.biz/Web/Downloads/g_/ds/smbj_eng_ds.pdf?mime=application%2Fpdf; Operating Supply Voltage: 45V; .SCHCHK: USED
footprint D-SMC-DO214AB-CA
pins: 1 I/O1, 2 I/O2

## TVS-5.0SMLJ90CA-TP
designator TVS?, comment 5.0SMLJ90CA  Clamping Voltage: 146V
TVS DIODE 90V 146V DO214AB; Manufacturer: MCC; Manufacturer Part Number: 5.0SMLJ90CA-TP; Max Surge Current: 34.3A; Number of Channels: 1; Polarity: Bidirectional; Breakdown Voltage: 111V; Peak Pulse Power: 5kW; Min Breakdown Voltage: 100V; Power Line Protection: No; Supplier 1: Digi-Key; Stock 1: 2842; Pricing 1: 1=1,71000, 10=1,45000, 100=1,10200, 500=0,95700, 1000=0,80040 (USD); RoHS: Yes; Mount: Surface Mount; Min Operating Temperature: -55°C; Max Operating Temperature: 175°C; Packaging: Tape and Reel; Package Quantity: 3000; Peak Pulse Current: 34.3A; Termination: SMD/SMT; Number of Bidirectional Channels: 1; Reverse Standoff Voltage: 90V; Resistor Type: Zener; ComponentLink1URL: http://www.mouser.com/ds/2/258/5.0SMLJ11A-5.0SMLJ170A(LSMC)-220449.pdf?src-supplier=Mouser; ComponentLink1Description: http://www.mouser.com/ds/2/258/5.0SMLJ11A-5.0SMLJ170A(LSMC)-220449.pdf?src-supplier=Mouser; ComponentLink2URL: http://www.mccsemi.com/up_pdf/5.0SMLJ11A-5.0SMLJ400A(LSMC)-J.pdf?src-supplier=Digi-Key; ComponentLink2Description: http://www.mccsemi.com/up_pdf/5.0SMLJ11A-5.0SMLJ400A(LSMC)-J.pdf?src-supplier=Digi-Key; Supplier Part Number 1: 5.0SMLJ90CA-TPMSCT-ND
footprint D-SMC-DO214AB
pins: A, C

## TVS-824001
designator TVS?, comment 824001
TVS DIODE 5V 9V SOT23-6L; Manufacturer: Wurth Electronics; Capacitance: 1pF; Direction: Unidirectional; Polarity: Bidirectional; Number of Bidirectional Channels: 4; Min Breakdown Voltage: 6.2V; Power Line Protection: Yes; Max Reverse Leakage Current: 2A; Test Current: 1mA; Max Surge Current: 5A; Operating Supply Voltage: 6V; Supplier 1: Digi-Key; Supplier Part Number 1: 732-4464-1-ND; Manufacturer Part Number: 824001; Stock: 1126; Pricing: 1=0.74, 10=0.706, 50=0.659, 100=0.612, 500=0.541 (USD); RoHS: Yes; Mount: Surface Mount; Case/Package: SOT-23; Number of Pins: 6; Min Operating Temperature: -55°C; Max Operating Temperature: 85°C; Package Quantity: 3000; Termination: SMD/SMT; Packaging: Tape and Reel; Working Voltage: 5V; Reverse Standoff Voltage: 5V; Clamping Voltage: 9V; ESD Protection: Yes; Max Breakdown Voltage: 6.2V; Breakdown Voltage: 6.2V; Number of Channels: 4; Peak Pulse Current: 5A; Length: 2.9mm; Height: 1.16mm; Width: 2.8mm; REACH SVHC: Unknown; Lead Free: Lead Free; ComponentLink1URL: https://datasheet.ciiva.com/22694/824001-22694065.pdf?src-supplier=Element14; ComponentLink1Description: https://datasheet.ciiva.com/22694/824001-22694065.pdf?src-supplier=Element14; ComponentLink2URL: https://datasheet.ciiva.com/15063/824001-15063556.pdf?src-supplier=Digi-Key; ComponentLink2Description: https://datasheet.ciiva.com/15063/824001-15063556.pdf?src-supplier=Digi-Key; ComponentLink3URL: https://datasheet.ciiva.com/15063/824001-15063557.pdf?src-supplier=Digi-Key; ComponentLink3Description: https://datasheet.ciiva.com/15063/824001-15063557.pdf?src-supplier=Digi-Key; ComponentLink4URL: https://datasheet.ciiva.com/15063/824001-15063558.pdf?src-supplier=Digi-Key; ComponentLink4Description: https://datasheet.ciiva.com/15063/824001-15063558.pdf?src-supplier=Digi-Key; ComponentLink5URL: https://datasheet.ciiva.com/1276/824001-1276087.pdf?src-supplier=Element14; ComponentLink5Description: https://datasheet.ciiva.com/1276/824001-1276087.pdf?src-supplier=Element14
footprint SOT23-6L
pins: 1 I/O1, 2 GND, 3 I/O2, 4 I/O3, 5 VDD, 6 I/O4

## TVS-ATV02W5V0B-HF
designator TVS?, comment ATV02W5  Min Breakdown Voltage: 6.4V
TVS DIODE 5V 9.2V SOD123; Manufacturer: Comchip; Manufacturer Part Number: ATV02W5V0B-HF; Number of Bidirectional Channels: 1; Peak Pulse Power: 200W; Power Line Protection: No; Peak Pulse Current: 21.74A; Washability: OK; .Creator: M.OZKAN; .PCBCHK: USED; Supplier 1: Digi-Key; Supplier Part Number 1: 641-1986-1-ND; Stock 1: 7901; Pricing 1: 1=0.37000, 10=0.30000, 25=0.27440, 100=0.17240, 250=0.17052, 500=0.15966, 1000=0.10856 (USD); RoHS: Yes; Mount: Surface Mount; Case/Package: SOD123F; Min Operating Temperature: -55°C; Max Operating Temperature: 150°C; Packaging: Tape and Reel; Reverse Standoff Voltage: 5V; Clamping Voltage: 9.2V; Package Quantity: 3000; Composition: Zener; ComponentLink1URL: http://www.mouser.com/ds/2/80/ATV02W-HF series RevB-769696.pdf?src-supplier=Mouser; ComponentLink1Description: http://www.mouser.com/ds/2/80/ATV02W-HF series RevB-769696.pdf?src-supplier=Mouser; ComponentLink2URL: http://www.comchiptech.com/cms/UserFiles/ATV02W-HF%20series%20RevA.pdf?src-supplier=Digi-Key; ComponentLink2Description: http://www.comchiptech.com/cms/UserFiles/ATV02W-HF%20series%20RevA.pdf?src-supplier=Digi-Key; .SCHCHK: USED
pins: A, C

## TVS-CDSOT23-0502B
designator TVS?, comment CDSOT23-0502B
TVS DIODE 5V 9V SOT23-3L; Manufacturer 1: Bourns; Direction: Bidirectional; Max Surge Current: 8.5A; Number of Channels: 2; Breakdown Voltage: 6V; Power Line Protection: No; Leakage Current: 2.5uA; Element Configuration: Dual; Capacitance: 15pF; Washability: OK; .Creator: M.OZKAN; .PCBCHK: USED; Supplier 1: Digi-Key; Manufacturer Part Number 1: CDSOT23-0502B; Stock 1: 34895; Pricing 1: 1=0,63000, 10=0,54100, 25=0,50480, 100=0,37490, 250=0,35616, 500=0,29272, 1000=0,23793 (USD); RoHS: Yes; Mount: Surface Mount; Case/Package: SOT-23; Number of Pins: 3; Contact Plating: Tin,Matte; Min Operating Temperature: -55°C; Max Operating Temperature: 125°C; Package Quantity: 3000; Packaging: Tape and Reel; Polarity: Bidirectional; Reverse Standoff Voltage: 5V; Clamping Voltage: 9V; Termination: SMD/SMT; Min Breakdown Voltage: 6V; Peak Pulse Current: 8.5A; Composition: Zener; Working Voltage: 5V; Number of Bidirectional Channels: 2; Depth: 1.4mm; Radiation Hardening: No; REACH SVHC: No SVHC; ComponentLink1URL: https://datasheet.ciiva.com/11193/cdsot23-0502b-11193841.pdf?src-supplier=Avnet; ComponentLink1Description: https://datasheet.ciiva.com/11193/cdsot23-0502b-11193841.pdf?src-supplier=Avnet; ComponentLink2URL: https://datasheet.ciiva.com/4510/cdsot23-0502b-63869-4510207.pdf?src-supplier=Mouser; ComponentLink2Description: https://datasheet.ciiva.com/4510/cdsot23-0502b-63869-4510207.pdf?src-supplier=Mouser; Supplier Part Number 1: CDSOT23-0502BCT-ND; .SCHCHK: USED
footprint SOT23-3
pins: 1 I/O1, 2 I/O2, 3 GND (power)
